# Altium footprint library PcbLib_ICs_part2.PcbLib: 66 footprints (part 1 of 5) (continued)
## 4116.4-3 [mm]
pads (7):
  rect 3x3.7 smd paste-10 mask+0.05: 2(-3.75,-8) 8(3.75,-8) 11(3.75,8) 17(-3.75,8)
  round 0 hole 3.4 unplated: EP(-10,0) EP(10,0)
  rrect37% 25.5x9.5 smd paste-10 mask+0.05: EP(0,0)
Top Overlay:
  region: -6.25,-7.75 -8,-6 -8,-9.25
  lines w0.2: -13.25,-3 ccw(c-11,-3) -11,-5.25 11,-5.25 ccw(c11,-3) 13.25,-3 13.25,3 ccw(c11,3) 11,5.25 -11,5.25 ccw(c-11,3) -13.25,3 -13.25,-3
Top Paste:
  rectangle: -11.75,-2.75 -10.75,-2
  rectangle: -11.75,2 -10.75,2.75
  region: 11.75,-2 10.75,-2 10.75,-2.75 11.75,-2.75
  region: 11.75,2.75 10.75,2.75 10.75,2 11.75,2
  region: 10.25,2.75 9.25,2.75 9.25,2 10.25,2
  region: 10.25,-2 9.25,-2 9.25,-2.75 10.25,-2.75
  region: 1.25,1.25 0.25,1.25 0.25,0.25 1.25,0.25
  region: 1.25,-0.25 0.25,-0.25 0.25,-1.25 1.25,-1.25
  region: 2.75,-0.25 1.75,-0.25 1.75,-1.25 2.75,-1.25
  region: 2.75,1.25 1.75,1.25 1.75,0.25 2.75,0.25
  region: 4.25,-0.25 3.25,-0.25 3.25,-1.25 4.25,-1.25
  region: 4.25,1.25 3.25,1.25 3.25,0.25 4.25,0.25
  region: 5.75,-0.25 4.75,-0.25 4.75,-1.25 5.75,-1.25
  region: 5.75,1.25 4.75,1.25 4.75,0.25 5.75,0.25
  region: 5.75,-1.75 4.75,-1.75 4.75,-2.75 5.75,-2.75
  region: 4.25,-1.75 3.25,-1.75 3.25,-2.75 4.25,-2.75
  region: 2.75,-1.75 1.75,-1.75 1.75,-2.75 2.75,-2.75
  region: 1.25,-1.75 0.25,-1.75 0.25,-2.75 1.25,-2.75
  region: 5.75,-3.25 4.75,-3.25 4.75,-4.25 5.75,-4.25
  region: 4.25,-3.25 3.25,-3.25 3.25,-4.25 4.25,-4.25
  region: 2.75,-3.25 1.75,-3.25 1.75,-4.25 2.75,-4.25
  region: 1.25,-3.25 0.25,-3.25 0.25,-4.25 1.25,-4.25
  region: 1.25,2.75 0.25,2.75 0.25,1.75 1.25,1.75
  region: 2.75,2.75 1.75,2.75 1.75,1.75 2.75,1.75
  region: 4.25,2.75 3.25,2.75 3.25,1.75 4.25,1.75
  region: 5.75,2.75 4.75,2.75 4.75,1.75 5.75,1.75
  region: 5.75,4.25 4.75,4.25 4.75,3.25 5.75,3.25
  region: 4.25,4.25 3.25,4.25 3.25,3.25 4.25,3.25
  region: 2.75,4.25 1.75,4.25 1.75,3.25 2.75,3.25
  region: 1.25,4.25 0.25,4.25 0.25,3.25 1.25,3.25
  region: 7.25,4.25 6.25,4.25 6.25,3.25 7.25,3.25
  region: 8.75,4.25 7.75,4.25 7.75,3.25 8.75,3.25
  region: 10.25,4.25 9.25,4.25 9.25,3.25 10.25,3.25
  region: 8.75,2.75 7.75,2.75 7.75,1.75 8.75,1.75
  region: 7.25,2.75 6.25,2.75 6.25,1.75 7.25,1.75
  region: 7.25,-3.25 6.25,-3.25 6.25,-4.25 7.25,-4.25
  region: 8.75,-3.25 7.75,-3.25 7.75,-4.25 8.75,-4.25
  region: 10.25,-3.25 9.25,-3.25 9.25,-4.25 10.25,-4.25
  region: 7.25,-1.75 6.25,-1.75 6.25,-2.75 7.25,-2.75
  region: 8.75,-1.75 7.75,-1.75 7.75,-2.75 8.75,-2.75
  region: 7.25,1.25 6.25,1.25 6.25,0.25 7.25,0.25
  region: 7.25,-0.25 6.25,-0.25 6.25,-1.25 7.25,-1.25
  region: 11.75,4.25 10.75,4.25 10.75,3.25 11.75,3.25
  region: 11.75,-3.25 10.75,-3.25 10.75,-4.25 11.75,-4.25
  rectangle: -11.75,-4.25 -10.75,-3.25
  rectangle: -11.75,3.25 -10.75,4.25
  rectangle: -7.25,-1.25 -6.25,-0.25
  rectangle: -7.25,0.25 -6.25,1.25
  rectangle: -10.25,-2.75 -9.25,-2
  rectangle: -8.75,-2.75 -7.75,-1.75
  rectangle: -7.25,-2.75 -6.25,-1.75
  rectangle: -10.25,-4.25 -9.25,-3.25
  rectangle: -8.75,-4.25 -7.75,-3.25
  rectangle: -7.25,-4.25 -6.25,-3.25
  rectangle: -7.25,1.75 -6.25,2.75
  rectangle: -8.75,1.75 -7.75,2.75
  rectangle: -10.25,2 -9.25,2.75
  rectangle: -10.25,3.25 -9.25,4.25
  rectangle: -8.75,3.25 -7.75,4.25
  rectangle: -7.25,3.25 -6.25,4.25
  rectangle: -1.25,3.25 -0.25,4.25
  rectangle: -2.75,3.25 -1.75,4.25
  rectangle: -4.25,3.25 -3.25,4.25
  rectangle: -5.75,3.25 -4.75,4.25
  rectangle: -5.75,1.75 -4.75,2.75
  rectangle: -4.25,1.75 -3.25,2.75
  rectangle: -2.75,1.75 -1.75,2.75
  rectangle: -1.25,1.75 -0.25,2.75
  rectangle: -1.25,-4.25 -0.25,-3.25
  rectangle: -2.75,-4.25 -1.75,-3.25
  rectangle: -4.25,-4.25 -3.25,-3.25
  rectangle: -5.75,-4.25 -4.75,-3.25
  rectangle: -1.25,-2.75 -0.25,-1.75
  rectangle: -2.75,-2.75 -1.75,-1.75
  rectangle: -4.25,-2.75 -3.25,-1.75
  rectangle: -5.75,-2.75 -4.75,-1.75
  rectangle: -5.75,0.25 -4.75,1.25
  rectangle: -5.75,-1.25 -4.75,-0.25
  rectangle: -4.25,0.25 -3.25,1.25
  rectangle: -4.25,-1.25 -3.25,-0.25
  rectangle: -2.75,0.25 -1.75,1.25
  rectangle: -2.75,-1.25 -1.75,-0.25
  rectangle: -1.25,-1.25 -0.25,-0.25
  rectangle: -1.25,0.25 -0.25,1.25
  rectangle: -3.5,6.25 -2.5,7.25
  rectangle: -5,6.25 -4,7.25
  rectangle: -3.5,7.5 -2.5,8.5
  rectangle: -5,7.5 -4,8.5
  rectangle: -5,8.75 -4,9.75
  rectangle: -3.5,8.75 -2.5,9.75
  rectangle: 4,8.75 5,9.75
  rectangle: 2.5,8.75 3.5,9.75
  rectangle: 2.5,7.5 3.5,8.5
  rectangle: 4,7.5 5,8.5
  rectangle: 2.5,6.25 3.5,7.25
  rectangle: 4,6.25 5,7.25
  region: -4,-6.25 -5,-6.25 -5,-7.25 -4,-7.25
  region: -2.5,-6.25 -3.5,-6.25 -3.5,-7.25 -2.5,-7.25
  region: -4,-7.5 -5,-7.5 -5,-8.5 -4,-8.5
  region: -2.5,-7.5 -3.5,-7.5 -3.5,-8.5 -2.5,-8.5
  region: -2.5,-8.75 -3.5,-8.75 -3.5,-9.75 -2.5,-9.75
  region: -4,-8.75 -5,-8.75 -5,-9.75 -4,-9.75
  region: 3.5,-8.75 2.5,-8.75 2.5,-9.75 3.5,-9.75
  region: 5,-8.75 4,-8.75 4,-9.75 5,-9.75
  region: 5,-7.5 4,-7.5 4,-8.5 5,-8.5
  region: 3.5,-7.5 2.5,-7.5 2.5,-8.5 3.5,-8.5
  region: 5,-6.25 4,-6.25 4,-7.25 5,-7.25
  region: 3.5,-6.25 2.5,-6.25 2.5,-7.25 3.5,-7.25
Top Assy:
  circle w0.05: c-10,0 r1.45
  circle w0.05: c10,0 r1.45
  lines w0.05: -6,-4 ccw(c-6,-4.5) -6.5,-4.5 -10.9,-4.5 cw(c-10.9,-2.9) -12.5,-2.9 -12.5,2.9 cw(c-10.9,2.9) -10.9,4.5 -6.5,4.5 ccw(c-6,4.5) -6,4 ; -5.25,-3.75 -5.25,-4.75 ; -5.25,3.75 -5.25,4.75 ; -4.75,-4.75 -5.25,-4.75 ; -4.75,4.75 -5.25,4.75 ; -3.75,-0.5 -6,-0.5 ; -3.75,0.5 -6,0.5 ; -2.75,-4.75 -0.5,-4.75 ; -2.75,4.75 -0.5,4.75 ; -2.562,-1.752 ccw(c-1.752,-1.752) -1.75,-2.563 1.75,-2.563 ; -2.563,-1.75 -2.563,1.752 ; -2.562,1.752 cw(c-1.751,1.752) -1.75,2.563 1.75,2.563 cw(c1.752,1.752) 2.562,1.752 ; -0.5,-3.75 -0.5,-4.75 ; -0.5,3.75 -0.5,4.75 ; 0.5,-3.75 0.5,-4.75 ; 0.5,3.75 0.5,4.75 ; 1.752,-2.562 ccw(c1.752,-1.752) 2.563,-1.75 2.563,1.75 ; 2.75,-4.75 0.5,-4.75 ; 2.75,4.75 0.5,4.75 ; 4.75,-4.75 5.25,-4.75 ; 4.75,4.75 5.25,4.75 ; 5.25,-3.75 5.25,-4.75 ; 5.25,3.75 5.25,4.75 ; 6,-4 cw(c6,-4.5) 6.5,-4.5 10.9,-4.5 ccw(c10.9,-2.9) 12.5,-2.9 12.5,2.9 ccw(c10.9,2.9) 10.9,4.5 6.5,4.5 cw(c6,4.5) 6,4 ; -6,-3.75 -6,-0.5 ; -6,-3.75 6,-3.75 ; -6,-3.75 -6,-4.75 -5.25,-4.75 ; -6,-0.5 -6,0.5 ; -6,0.5 -6,3.75 ; -6,3.75 6,3.75 ; -6,3.75 -6,4.75 -5.25,4.75 ; -4.75,-6.75 -2.75,-6.75 ; -4.75,-6.75 -4.75,-6.5 ; -4.75,-6.75 -4.75,-8.75 -2.75,-8.75 -2.75,-6.75 ; -4.75,-6.5 -2.75,-6.5 ; -4.75,-6.5 -4.75,-6 ; -4.75,-6 -2.75,-6 ; -4.75,-6 -4.75,-4 -0.75,-4 -0.75,-4.375 -2.75,-4.375 -2.75,-6 ; -4.75,6 -4.75,4 -0.75,4 -0.75,4.375 -2.75,4.375 -2.75,6 ; -4.75,6 -2.75,6 ; -4.75,6 -4.75,6.5 ; -4.75,6.5 -2.75,6.5 ; -4.75,6.5 -4.75,6.75 ; -4.75,6.75 -2.75,6.75 ; -4.75,6.75 -4.75,8.75 -2.75,8.75 -2.75,6.75 ; -3.09,-1.751 ccw(c-1.752,-1.751) -1.752,-3.089 ; -3.09,-1.751 -2.036,-1.751 ; -3.089,-1.751 -3.089,1.751 ; -3.089,1.751 cw(c-1.751,1.751) -1.751,3.089 ; -3.089,1.751 -2.036,1.751 ; -2.75,-6.75 -2.75,-6.5 ; -2.75,-6.5 -2.75,-6 ; -2.75,6 -2.75,6.5 ; -2.75,6.5 -2.75,6.75 ; -2.036,-1.751 ccw(c-1.751,-1.751) -1.75,-2.036 ; -2.036,-1.75 -2.036,1.751 ; -2.036,1.751 cw(c-1.75,1.751) -1.75,2.036 ; -1.752,-3.089 -1.75,-2.036 ; -1.752,-3.089 1.751,-3.089 ; -1.751,3.089 -1.75,2.036 ; -1.751,3.089 1.752,3.089 ; -1.75,-2.036 1.75,-2.036 ; -1.75,2.036 1.75,2.036 ; -0.5,-4.75 0.5,-4.75 ; -0.5,4.75 0.5,4.75 ; 1.751,-2.036 ccw(c1.751,-1.751) 2.036,-1.75 ; 1.751,-2.036 1.751,-3.09 ; 1.75,2.036 cw(c1.751,1.751) 2.036,1.751 ; 1.75,2.036 1.752,3.089 ; 1.751,-3.09 ccw(c1.751,-1.752) 3.089,-1.752 ; 1.752,3.089 cw(c1.752,1.751) 3.09,1.751 ; 2.036,-1.75 3.089,-1.752 ; 2.036,-1.75 2.036,1.75 ; 2.036,1.751 3.09,1.751 ; 2.75,-6.75 4.75,-6.75 ; 2.75,-6.75 2.75,-6.5 ; 2.75,-6.75 2.75,-8.75 4.75,-8.75 4.75,-6.75 ; 2.75,-6.5 4.75,-6.5 ; 2.75,-6.5 2.75,-6 ; 2.75,-6 4.75,-6 ; 2.75,-6 2.75,-4.375 0.75,-4.375 0.75,-4 4.75,-4 4.75,-6 ; 2.75,6 4.75,6 ; 2.75,6 2.75,4.375 0.75,4.375 0.75,4 4.75,4 4.75,6 ; 2.75,6 2.75,6.5 ; 2.75,6.5 4.75,6.5 ; 2.75,6.5 2.75,6.75 ; 2.75,6.75 4.75,6.75 ; 2.75,6.75 2.75,8.75 4.75,8.75 4.75,6.75 ; 3.089,-1.752 3.089,1.751 ; 4.75,-6.75 4.75,-6.5 ; 4.75,-6.5 4.75,-6 ; 4.75,6 4.75,6.5 ; 4.75,6.5 4.75,6.75 ; 5.25,-4.75 6,-4.75 6,-3.75 ; 5.25,4.75 6,4.75 6,3.75 ; 6,-3.75 6,3.75 ; -5.5,-1.75 -5,-3 -4.5,-1.75 -5.5,-1.75 ; -3.75,-3.7 3.75,-3.7 3.75,3.7 -3.75,3.7 -3.75,-3.7
  text ".Designator" at -3.443,-0.467 h2
3D body "4116_4-3-1.x_t": height 3.35, standoff 0, extent -12.5,-8.75 12.5,8.75

## 4153.20-6 [mm]
pads (20):
  rect 3x0.8 smd paste+0 mask+0.05: 1(-8.15,5.6)
  oval 3x0.8 smd paste+0 mask+0.05: 2(-8.15,4.35) 3(-8.15,3.1) 4(-8.15,1.85) 5(-8.15,0.6) 6(-8.15,-0.65) 7(-8.15,-1.9) 8(-8.15,-3.15) 9(-8.15,-4.4) 10(-8.15,-5.65) 11(8.1,-5.65) 12(8.1,-4.4) 13(8.1,-3.15) 14(8.1,-1.9) 15(8.1,-0.65) 16(8.1,0.6) 17(8.1,1.85) 18(8.1,3.1) 19(8.1,4.35) 20(8.1,5.6)
Top Overlay:
  circle w0.25: c-8.025,6.9 r0.125
  lines w0.2: -6.275,-6.15 -6.275,-6.775 6.225,-6.775 6.225,-6.15 ; -6.275,6.1 -6.275,6.725 6.225,6.725 6.225,6.1
Top Assy:
  drawing of 436 lines, arcs and shapes, not listed
  text ".Designator" at -3.443,-0.467 h2
3D body "4153_20-6.STEP": height 3.04, standoff 0, extent -8.75,-6.5 8.75,6.5

## 4229.132-3 [mm]
height 4.1
pads (132):
  rect 2.55x0.45 smd paste+0 mask+0.05: 1(-16.6,10)
  oval 2.55x0.45 smd paste+0 mask+0.05: 2(-16.6,9.375) 3(-16.6,8.75) 4(-16.6,8.125) 5(-16.6,7.5) 6(-16.6,6.875) 7(-16.6,6.25) 8(-16.6,5.625) 9(-16.6,5) 10(-16.6,4.375) 11(-16.6,3.75) 12(-16.6,3.125) 13(-16.6,2.5) 14(-16.6,1.875) 15(-16.6,1.25) 16(-16.6,0.625) 17(-16.6,0) 18(-16.6,-0.625) 19(-16.6,-1.25) 20(-16.6,-1.875) 21(-16.6,-2.5) 22(-16.6,-3.125) 23(-16.6,-3.75) 24(-16.6,-4.375) 25(-16.6,-5) 26(-16.6,-5.625) 27(-16.6,-6.25) 28(-16.6,-6.875) 29(-16.6,-7.5) 30(-16.6,-8.125) 31(-16.6,-8.75) 32(-16.6,-9.375) 33(-16.6,-10) 67(16.6,-10) 68(16.6,-9.375) 69(16.6,-8.75) 70(16.6,-8.125) 71(16.6,-7.5) 72(16.6,-6.875) 73(16.6,-6.25) 74(16.6,-5.625) 75(16.6,-5) 76(16.6,-4.375) 77(16.6,-3.75) 78(16.6,-3.125) 79(16.6,-2.5) 80(16.6,-1.875) 81(16.6,-1.25) 82(16.6,-0.625) 83(16.6,0) 84(16.6,0.625) 85(16.6,1.25) 86(16.6,1.875) 87(16.6,2.5) 88(16.6,3.125) 89(16.6,3.75) 90(16.6,4.375) 91(16.6,5) 92(16.6,5.625) 93(16.6,6.25) 94(16.6,6.875) 95(16.6,7.5) 96(16.6,8.125) 97(16.6,8.75) 98(16.6,9.375) 99(16.6,10)
  oval 0.45x2.55 smd paste+0 mask+0.05: 34(-10,-16.6) 35(-9.375,-16.6) 36(-8.75,-16.6) 37(-8.125,-16.6) 38(-7.5,-16.6) 39(-6.875,-16.6) 40(-6.25,-16.6) 41(-5.625,-16.6) 42(-5,-16.6) 43(-4.375,-16.6) 44(-3.75,-16.6) 45(-3.125,-16.6) 46(-2.5,-16.6) 47(-1.875,-16.6) 48(-1.25,-16.6) 49(-0.625,-16.6) 50(0,-16.6) 51(0.625,-16.6) 52(1.25,-16.6) 53(1.875,-16.6) 54(2.5,-16.6) 55(3.125,-16.6) 56(3.75,-16.6) 57(4.375,-16.6) 58(5,-16.6) 59(5.625,-16.6) 60(6.25,-16.6) 61(6.875,-16.6) 62(7.5,-16.6) 63(8.125,-16.6) 64(8.75,-16.6) 65(9.375,-16.6) 66(10,-16.6) 100(10,16.6) 101(9.375,16.6) 102(8.75,16.6) 103(8.125,16.6) 104(7.5,16.6) 105(6.875,16.6) 106(6.25,16.6) 107(5.625,16.6) 108(5,16.6) 109(4.375,16.6) 110(3.75,16.6) 111(3.125,16.6) 112(2.5,16.6) 113(1.875,16.6) 114(1.25,16.6) 115(0.625,16.6) 116(0,16.6) 117(-0.625,16.6) 118(-1.25,16.6) 119(-1.875,16.6) 120(-2.5,16.6) 121(-3.125,16.6) 122(-3.75,16.6) 123(-4.375,16.6) 124(-5,16.6) 125(-5.625,16.6) 126(-6.25,16.6) 127(-6.875,16.6) 128(-7.5,16.6) 129(-8.125,16.6) 130(-8.75,16.6) 131(-9.375,16.6) 132(-10,16.6)
Top Overlay:
  circle w0.6: c-12.775,12.775 r0.3
  circle w0.25: c-16.6,10.8 r0.125
  lines w0.2: -14.2,-13.6 -14.2,-14.2 -13.575,-14.2 ; -14.2,13.575 -14.2,14.2 -13.6,14.2 ; 13.575,14.2 14.2,14.2 14.2,13.6 ; 13.6,-14.2 14.2,-14.2 14.2,-13.575
Top Assy:
  drawing of 3347 lines, arcs and shapes, not listed
  text ".Designator" at -6.886,-0.933 h4
Top Text:
  lines w0.05: -18,-18 18,-18 18,18 -18,18 -18,-18
  lines w0.1: -0.5,0 0.5,0 ; 0,-0.5 0,0.5
3D body "STEP_4229.132-3111.x_t": height 3.6, standoff -0.05, extent -17.1,-17.1 17.1,17.1

## 4250.208-1 [mm]
height 4.1
pads (208):
  rect 4x0.3 smd paste+0 mask+0.05: 1(-18.2,12.75)
  oval 4x0.3 smd paste+0 mask+0.05: 2(-18.2,12.25) 3(-18.2,11.75) 4(-18.2,11.25) 5(-18.2,10.75) 6(-18.2,10.25) 7(-18.2,9.75) 8(-18.2,9.25) 9(-18.2,8.75) 10(-18.2,8.25) 11(-18.2,7.75) 12(-18.2,7.25) 13(-18.2,6.75) 14(-18.2,6.25) 15(-18.2,5.75) 16(-18.2,5.25) 17(-18.2,4.75) 18(-18.2,4.25) 19(-18.2,3.75) 20(-18.2,3.25) 21(-18.2,2.75) 22(-18.2,2.25) 23(-18.2,1.75) 24(-18.2,1.25) 25(-18.2,0.75) 26(-18.2,0.25) 27(-18.2,-0.25) 28(-18.2,-0.75) 29(-18.2,-1.25) 30(-18.2,-1.75) 31(-18.2,-2.25) 32(-18.2,-2.75) 33(-18.2,-3.25) 34(-18.2,-3.75) 35(-18.2,-4.25) 36(-18.2,-4.75) 37(-18.2,-5.25) 38(-18.2,-5.75) 39(-18.2,-6.25) 40(-18.2,-6.75) 41(-18.2,-7.25) 42(-18.2,-7.75) 43(-18.2,-8.25) 44(-18.2,-8.75) 45(-18.2,-9.25) 46(-18.2,-9.75) 47(-18.2,-10.25) 48(-18.2,-10.75) 49(-18.2,-11.25) 50(-18.2,-11.75) 51(-18.2,-12.25) 52(-18.2,-12.75) 105(18.2,-12.75) 106(18.2,-12.25) 107(18.2,-11.75) 108(18.2,-11.25) 109(18.2,-10.75) 110(18.2,-10.25) 111(18.2,-9.75) 112(18.2,-9.25) 113(18.2,-8.75) 114(18.2,-8.25) 115(18.2,-7.75) 116(18.2,-7.25) 117(18.2,-6.75) 118(18.2,-6.25) 119(18.2,-5.75) 120(18.2,-5.25) 121(18.2,-4.75) 122(18.2,-4.25) 123(18.2,-3.75) 124(18.2,-3.25) 125(18.2,-2.75) 126(18.2,-2.25) 127(18.2,-1.75) 128(18.2,-1.25) 129(18.2,-0.75) 130(18.2,-0.25) 131(18.2,0.25) 132(18.2,0.75) 133(18.2,1.25) 134(18.2,1.75) 135(18.2,2.25) 136(18.2,2.75) 137(18.2,3.25) 138(18.2,3.75) 139(18.2,4.25) 140(18.2,4.75) 141(18.2,5.25) 142(18.2,5.75) 143(18.2,6.25) 144(18.2,6.75) 145(18.2,7.25) 146(18.2,7.75) 147(18.2,8.25) 148(18.2,8.75) 149(18.2,9.25) 150(18.2,9.75) 151(18.2,10.25) 152(18.2,10.75) 153(18.2,11.25) 154(18.2,11.75) 155(18.2,12.25) 156(18.2,12.75)
  oval 0.3x4 smd paste+0 mask+0.05: 53(-12.75,-18.2) 54(-12.25,-18.2) 55(-11.75,-18.2) 56(-11.25,-18.2) 57(-10.75,-18.2) 58(-10.25,-18.2) 59(-9.75,-18.2) 60(-9.25,-18.2) 61(-8.75,-18.2) 62(-8.25,-18.2) 63(-7.75,-18.2) 64(-7.25,-18.2) 65(-6.75,-18.2) 66(-6.25,-18.2) 67(-5.75,-18.2) 68(-5.25,-18.2) 69(-4.75,-18.2) 70(-4.25,-18.2) 71(-3.75,-18.2) 72(-3.25,-18.2) 73(-2.75,-18.2) 74(-2.25,-18.2) 75(-1.75,-18.2) 76(-1.25,-18.2) 77(-0.75,-18.2) 78(-0.25,-18.2) 79(0.25,-18.2) 80(0.75,-18.2) 81(1.25,-18.2) 82(1.75,-18.2) 83(2.25,-18.2) 84(2.75,-18.2) 85(3.25,-18.2) 86(3.75,-18.2) 87(4.25,-18.2) 88(4.75,-18.2) 89(5.25,-18.2) 90(5.75,-18.2) 91(6.25,-18.2) 92(6.75,-18.2) 93(7.25,-18.2) 94(7.75,-18.2) 95(8.25,-18.2) 96(8.75,-18.2) 97(9.25,-18.2) 98(9.75,-18.2) 99(10.25,-18.2) 100(10.75,-18.2) 101(11.25,-18.2) 102(11.75,-18.2) 103(12.25,-18.2) 104(12.75,-18.2) 157(12.75,18.2) 158(12.25,18.2) 159(11.75,18.2) 160(11.25,18.2) 161(10.75,18.2) 162(10.25,18.2) 163(9.75,18.2) 164(9.25,18.2) 165(8.75,18.2) 166(8.25,18.2) 167(7.75,18.2) 168(7.25,18.2) 169(6.75,18.2) 170(6.25,18.2) 171(5.75,18.2) 172(5.25,18.2) 173(4.75,18.2) 174(4.25,18.2) 175(3.75,18.2) 176(3.25,18.2) 177(2.75,18.2) 178(2.25,18.2) 179(1.75,18.2) 180(1.25,18.2) 181(0.75,18.2) 182(0.25,18.2) 183(-0.25,18.2) 184(-0.75,18.2) 185(-1.25,18.2) 186(-1.75,18.2) 187(-2.25,18.2) 188(-2.75,18.2) 189(-3.25,18.2) 190(-3.75,18.2) 191(-4.25,18.2) 192(-4.75,18.2) 193(-5.25,18.2) 194(-5.75,18.2) 195(-6.25,18.2) 196(-6.75,18.2) 197(-7.25,18.2) 198(-7.75,18.2) 199(-8.25,18.2) 200(-8.75,18.2) 201(-9.25,18.2) 202(-9.75,18.2) 203(-10.25,18.2) 204(-10.75,18.2) 205(-11.25,18.2) 206(-11.75,18.2) 207(-12.25,18.2) 208(-12.75,18.2)
Top Overlay:
  circle w0.6: c-12.775,12.775 r0.3
  circle w0.25: c-20,13.5 r0.125
  lines w0.2: -21.5,-12.75 -20.5,-12.75 ; -21.5,-6.25 -20.5,-6.25 ; -21.5,0.25 -20.5,0.25 ; -21.5,6.75 -20.5,6.75 ; -21.5,12.75 -20.5,12.75 ; -14.5,-13.9 -14.5,-14.5 -13.875,-14.5 ; -14.5,13.875 -14.5,14.5 -13.9,14.5 ; -12.75,-21.5 -12.75,-20.5 ; -12.75,20.5 -12.75,21.5 ; -6.75,-21.5 -6.75,-20.5 ; -6.25,20.5 -6.25,21.5 ; -0.25,-21.5 -0.25,-20.5 ; 0.25,20.5 0.25,21.5 ; 6.25,-21.5 6.25,-20.5 ; 6.75,20.5 6.75,21.5 ; 12.75,-21.5 12.75,-20.5 ; 12.75,20.5 12.75,21.5 ; 13.875,14.5 14.5,14.5 14.5,13.9 ; 13.9,-14.5 14.5,-14.5 14.5,-13.875 ; 20.5,-12.75 21.5,-12.75 ; 20.5,-6.75 21.5,-6.75 ; 20.5,-0.25 21.5,-0.25 ; 20.5,6.25 21.5,6.25 ; 20.5,12.75 21.5,12.75
Top Assy:
  drawing of 9004 lines, arcs and shapes, not listed
  text ".Designator" at -3.569,-0.597 h2
Top Text:
  lines w0.05: -15.95,-15.95 15.95,-15.95 15.95,15.95 -15.95,15.95 -15.95,-15.95
  lines w0.1: -0.5,0 0.5,0 ; 0,-0.5 0,0.5
3D body "4_korpus_4250_208-1f.stp": height 3.1, standoff 0, extent -20.2,-20.2 20.2,20.2

## 4601.3-1 [mm]
pads (5):
  rrect50% 0.8x1.5 smd: 1(-1.55,-2.5) 2(1.45,-2.5)
  rrect50% 0.8x3.5 smd paste-10: 3(-0.05,-1.5)
  rect 3.5x3 smd paste-10: 3(-0.05,0.5)
  rrect50% 0.8x1.5 smd paste-10: 3(-0.05,2.5)
Top Overlay:
  lines w0.2: -2.083,-2.856 -2.439,-2.856 -2.464,-2.83 -2.464,2.555 -2.439,2.58 -0.712,2.58 ; 0.609,2.58 2.336,2.58 2.362,2.555 2.362,-2.83 2.336,-2.856 1.981,-2.856
Top Paste:
  rectangle: -1.7,1.35 -1.15,1.9
  rectangle: -1.05,1.35 -0.5,1.9
  rectangle: -0.35,1.35 0.2,1.9
  rectangle: 0.35,1.35 0.9,1.9
  rectangle: 1.05,1.35 1.6,1.9
  rectangle: -0.3,2.6 0.2,3.1
  rectangle: -0.3,2 0.2,2.5
  rectangle: 1.05,0.7 1.6,1.25
  rectangle: 0.35,0.7 0.9,1.25
  rectangle: -0.35,0.7 0.2,1.25
  rectangle: -1.05,0.7 -0.5,1.25
  rectangle: -1.7,0.7 -1.15,1.25
  rectangle: 1.05,0.05 1.6,0.6
  rectangle: 0.35,0.05 0.9,0.6
  rectangle: -0.35,0.05 0.2,0.6
  rectangle: -1.05,0.05 -0.5,0.6
  rectangle: -1.7,0.05 -1.15,0.6
  rectangle: 1.05,-0.9 1.6,-0.05
  rectangle: 0.35,-0.9 0.9,-0.05
  rectangle: -0.35,-0.9 0.2,-0.05
  rectangle: -1.05,-0.9 -0.5,-0.05
  rectangle: -1.7,-0.9 -1.15,-0.05
  rectangle: -0.3,-2.1 0.2,-1.6
  rectangle: -0.3,-1.5 0.2,-1
  rectangle: -0.3,-3.15 0.2,-2.8
  rectangle: -0.3,-2.7 0.2,-2.2
Bottom Simple Assy:
  rectangle: -0.3,2.35 0.2,2.85
  rectangle: -1.8,-2.75 -1.3,-2.25
  rectangle: -0.3,-2.75 0.2,-2.25
  rectangle: 1.2,-2.75 1.7,-2.25
Top Assy:
  lines w0.05: -1.75,-2.1 -1.75,-2.55 ; -1.7,-2.1 -1.7,-2.55 ; -1.3,-2.1 -1.3,-2.55 ; -1.25,-2.1 -1.25,-2.55 ; -0.25,-2.1 -0.25,-2.55 ; -0.25,2.1 -0.25,2.55 ; -0.2,-2.1 -0.2,-2.55 ; -0.2,2.1 -0.2,2.55 ; 0.2,-2.1 0.2,-2.55 ; 0.2,2.1 0.2,2.55 ; 0.25,-2.1 0.25,-2.55 ; 0.25,2.1 0.25,2.55 ; 1.25,-2.1 1.25,-2.55 ; 1.3,-2.1 1.3,-2.55 ; 1.7,-2.1 1.7,-2.55 ; 1.75,-2.1 1.75,-2.55 ; -2.3,-2.05 -2.3,2.05 ; -2.3,-2.05 -2.25,-2.05 ; -2.3,-2.05 -2.25,-2.1 ; -2.3,2.05 -2.25,2.1 ; -2.3,2.05 -2.25,2.05 ; -2.25,-2.1 2.25,-2.1 ; -2.25,-2.1 -2.25,-2.05 ; -2.25,-2.05 -2.25,2.05 ; -2.25,-2.05 2.25,-2.05 ; -2.25,2.05 -2.25,2.1 ; -2.25,2.05 2.25,2.05 ; -2.25,2.1 2.25,2.1 ; -2.15,-1.75 ccw(c-1.95,-1.75) -1.95,-1.95 ; -2.15,-1.75 -2.1,-1.75 ; -2.15,-1.75 -2.15,1.75 ; -2.15,1.75 cw(c-1.95,1.75) -1.95,1.95 ; -2.15,1.75 -2.1,1.75 ; -2.1,-1.75 ccw(c-1.95,-1.75) -1.95,-1.9 ; -2.1,-1.75 -2.1,1.75 ; -2.1,1.75 cw(c-1.95,1.75) -1.95,1.9 ; -1.95,-1.95 -1.95,-1.9 ; -1.95,-1.95 1.95,-1.95 ; -1.95,-1.9 1.95,-1.9 ; -1.95,1.9 -1.95,1.95 ; -1.95,1.9 1.95,1.9 ; -1.95,1.95 1.95,1.95 ; -1.75,-2.55 -1.7,-2.55 ; -1.75,-2.55 -1.7,-2.6 ; -1.75,-0.95 ccw(c-1.15,-0.95) -1.15,-1.55 ; -1.75,-0.95 -1.75,0.95 ; -1.75,-0.95 -1.663,-0.95 ; -1.75,0.95 cw(c-1.15,0.95) -1.15,1.55 ; -1.75,0.95 -1.663,0.95 ; -1.7,-2.6 -1.7,-2.55 ; -1.7,-2.6 -1.3,-2.6 ; -1.7,-2.55 -1.3,-2.55 ; -1.663,-0.95 ccw(c-1.15,-0.95) -1.15,-1.463 ; -1.663,-0.95 -1.663,0.95 ; -1.663,-0.95 -1.577,-0.95 ; -1.663,0.95 cw(c-1.15,0.95) -1.15,1.463 ; -1.663,0.95 -1.577,0.95 ; -1.577,-0.95 ccw(c-1.15,-0.95) -1.15,-1.377 ; -1.577,-0.95 -1.577,0.95 ; -1.577,0.95 cw(c-1.15,0.95) -1.15,1.377 ; -1.3,-2.6 -1.25,-2.55 ; -1.3,-2.6 -1.3,-2.55 ; -1.3,-2.55 -1.25,-2.55 ; -1.15,-1.55 1.15,-1.55 ; -1.15,-1.55 -1.15,-1.463 ; -1.15,-1.463 -1.15,-1.377 ; -1.15,-1.463 1.15,-1.463 ; -1.15,-1.377 1.15,-1.377 ; -1.15,1.377 -1.15,1.463 ; -1.15,1.377 1.15,1.377 ; -1.15,1.463 -1.15,1.55 ; -1.15,1.463 1.15,1.463 ; -1.15,1.55 1.15,1.55 ; -0.25,-2.55 -0.2,-2.55 ; -0.25,-2.55 -0.2,-2.6 ; -0.25,2.55 -0.2,2.6 ; -0.25,2.55 -0.2,2.55 ; -0.2,-2.6 0.2,-2.6 ; -0.2,-2.6 -0.2,-2.55 ; -0.2,-2.55 0.2,-2.55 ; -0.2,2.55 -0.2,2.6 ; -0.2,2.55 0.2,2.55 ; -0.2,2.6 0.2,2.6 ; 0.2,-2.6 0.25,-2.55 ; 0.2,-2.6 0.2,-2.55 ; 0.2,-2.55 0.25,-2.55 ; 0.2,2.55 0.2,2.6 ; 0.2,2.55 0.25,2.55 ; 0.2,2.6 0.25,2.55 ; 1.15,-1.55 ccw(c1.15,-0.95) 1.75,-0.95 ; 1.15,-1.55 1.15,-1.463 ; 1.15,-1.463 ccw(c1.15,-0.95) 1.663,-0.95 ; 1.15,-1.463 1.15,-1.377 ; 1.15,-1.377 ccw(c1.15,-0.95) 1.577,-0.95 ; 1.15,1.377 cw(c1.15,0.95) 1.577,0.95 ; 1.15,1.377 1.15,1.463 ; 1.15,1.463 cw(c1.15,0.95) 1.663,0.95 ; 1.15,1.463 1.15,1.55 ; 1.15,1.55 cw(c1.15,0.95) 1.75,0.95 ; 1.25,-2.55 1.3,-2.55 ; 1.25,-2.55 1.3,-2.6 ; 1.3,-2.6 1.7,-2.6 ; 1.3,-2.6 1.3,-2.55 ; 1.3,-2.55 1.7,-2.55 ; 1.577,-0.95 1.663,-0.95 ; 1.577,-0.95 1.577,0.95 ; 1.577,0.95 1.663,0.95 ; 1.663,-0.95 1.75,-0.95 ; 1.663,-0.95 1.663,0.95 ; 1.663,0.95 1.75,0.95 ; 1.7,-2.6 1.7,-2.55 ; 1.7,-2.6 1.75,-2.55 ; 1.7,-2.55 1.75,-2.55 ; 1.75,-0.95 1.75,0.95 ; 1.95,-1.95 ccw(c1.95,-1.75) 2.15,-1.75 ; 1.95,-1.95 1.95,-1.9 ; 1.95,-1.9 ccw(c1.95,-1.75) 2.1,-1.75 ; 1.95,1.9 cw(c1.95,1.75) 2.1,1.75 ; 1.95,1.9 1.95,1.95 ; 1.95,1.95 cw(c1.95,1.75) 2.15,1.75 ; 2.1,-1.75 2.15,-1.75 ; 2.1,-1.75 2.1,1.75 ; 2.1,1.75 2.15,1.75 ; 2.15,-1.75 2.15,1.75 ; 2.25,-2.1 2.25,-2.05 ; 2.25,-2.1 2.3,-2.05 ; 2.25,-2.05 2.25,2.05 ; 2.25,-2.05 2.3,-2.05 ; 2.25,2.05 2.25,2.1 ; 2.25,2.05 2.3,2.05 ; 2.25,2.1 2.3,2.05 ; 2.3,-2.05 2.3,2.05
  text ".Designator" at -2.579,-0.349 h1.5
3D body "User Library-4601_3-1.step": height 1.74, standoff 0, extent -2.3,-2.6 2.3,2.6

## 5119.16-A [mm]
pads (16):
  rect 3x0.8 smd paste+0 mask+0.05: 1(2.625,0.65)
  rect 1.6x0.8 smd paste+0 mask+0.05: 2(3.375,1.92) 7(-3.375,1.92) 8(-3.375,0.65) 9(-3.375,-0.62) 10(-3.375,-1.89) 15(3.375,-1.89) 16(3.375,-0.62)
  rect 0.8x1.6 smd paste+0 mask+0.05: 3(1.905,3.39) 4(0.635,3.39) 5(-0.635,3.39) 6(-1.905,3.39) 11(-1.905,-3.36) 12(-0.635,-3.36) 13(0.635,-3.36) 14(1.905,-3.36)
Top Overlay:
  region: 4.445,0.65 5.067,1.044 5.067,0.282
  lines w0.2: -3.912,-2.398 -3.912,-2.83 -2.845,-3.897 -2.413,-3.897 ; -3.912,2.428 -3.912,2.86 -2.845,3.926 -2.413,3.926 ; 2.413,-3.897 2.845,-3.897 3.911,-2.83 3.911,-2.398 ; 2.489,3.901 3.2,3.901 3.353,3.901 3.886,3.368 3.911,3.342 3.911,3.241 3.911,2.428
Top Assy:
  drawing of 5107 lines, arcs and shapes, not listed
  text ".Designator" at -3.443,-0.467 h2
3D body "3_korpus_5119_16-a.stp": height 2.12, standoff 0, extent -3.81,-3.81 3.81,3.81

## 5121.20-A [mm]
pads (20):
  rect 3x0.8 smd paste+0 mask+0.05: 1(-3.325,0)
  rect 1.6x0.8 smd paste+0 mask+0.05: 2(-4.025,-1.27) 3(-4.025,-2.54) 9(3.995,-2.54) 10(3.995,-1.27) 11(3.995,0) 12(3.995,1.27) 13(3.995,2.54) 19(-4.025,2.54) 20(-4.025,1.27)
  rect 0.8x1.6 smd paste+0 mask+0.05: 4(-2.555,-4.01) 5(-1.285,-4.01) 6(-0.015,-4.01) 7(1.255,-4.01) 8(2.525,-4.01) 14(2.525,4.04) 15(1.255,4.04) 16(-0.015,4.04) 17(-1.285,4.04) 18(-2.555,4.04)
Top Overlay:
  region: -5.171,0 -5.794,0.394 -5.794,-0.368
  lines w0.2: -4.562,3.048 -4.562,3.48 -3.495,4.546 -3.063,4.546 ; -4.536,-3.048 -4.536,-3.48 -3.47,-4.547 -3.038,-4.547 ; 3.033,-4.547 3.465,-4.547 4.531,-3.48 4.531,-3.048 ; 3.033,4.521 3.744,4.521 3.896,4.521 4.43,3.988 4.455,3.962 4.455,3.861 4.455,3.048
Top Assy:
  drawing of 6375 lines, arcs and shapes, not listed
  text ".Designator" at -3.443,-0.467 h2
3D body "3_korpus_5121_20-a.stp": height 2.12, standoff 0, extent -4.445,-4.445 4.445,4.445

## 5140.8-ï¿½ï¿½ï¿½ [mm] "5mm x 5mm"
pads (8):
  rect 2x0.8 smd paste-0.05 mask+0.075: 1(-1.903,1.257) 2(-1.903,-0.013) 3(-1.903,-1.283) 5(1.907,-1.283) 6(1.907,-0.013) 7(1.907,1.257)
  rect 0.8x2 smd paste-0.05 mask+0.075: 4(0.002,-1.918)
  rect 0.8x3 smd paste-0.05 mask+0.075: 8(0.002,1.257)
Top Overlay:
  circle w0.2: c-3.137,2.257 r0.1
  lines w0.2: -2.613,-1.868 -2.613,-2.618 -1.863,-2.618 ; -2.588,1.857 -2.588,2.607 -1.837,2.607 ; 1.862,-2.618 2.612,-2.618 2.612,-1.868 ; 1.862,2.607 2.612,2.607 2.612,1.857
Top Assy:
  drawing of 236 lines, arcs and shapes, not listed
  text ".Designator" at -3.443,-0.467 h2
3D body "5140.8-���.STEP": height 1.81, standoff -0.01, extent -2.512,-2.518 2.488,2.483